# Altium footprint library Library 3D.PcbLib: 288 footprints (part 16 of 18)
Each footprint in its own frame and in the unit in brackets; x right, y up, seen from the top. Pads: shape width x height; smd on the part's side, far side on the other; paste and mask are expansions set on the pad; w line width, h text height; cw(c..) or ccw(c..) is an arc to the next point about the centre after c.
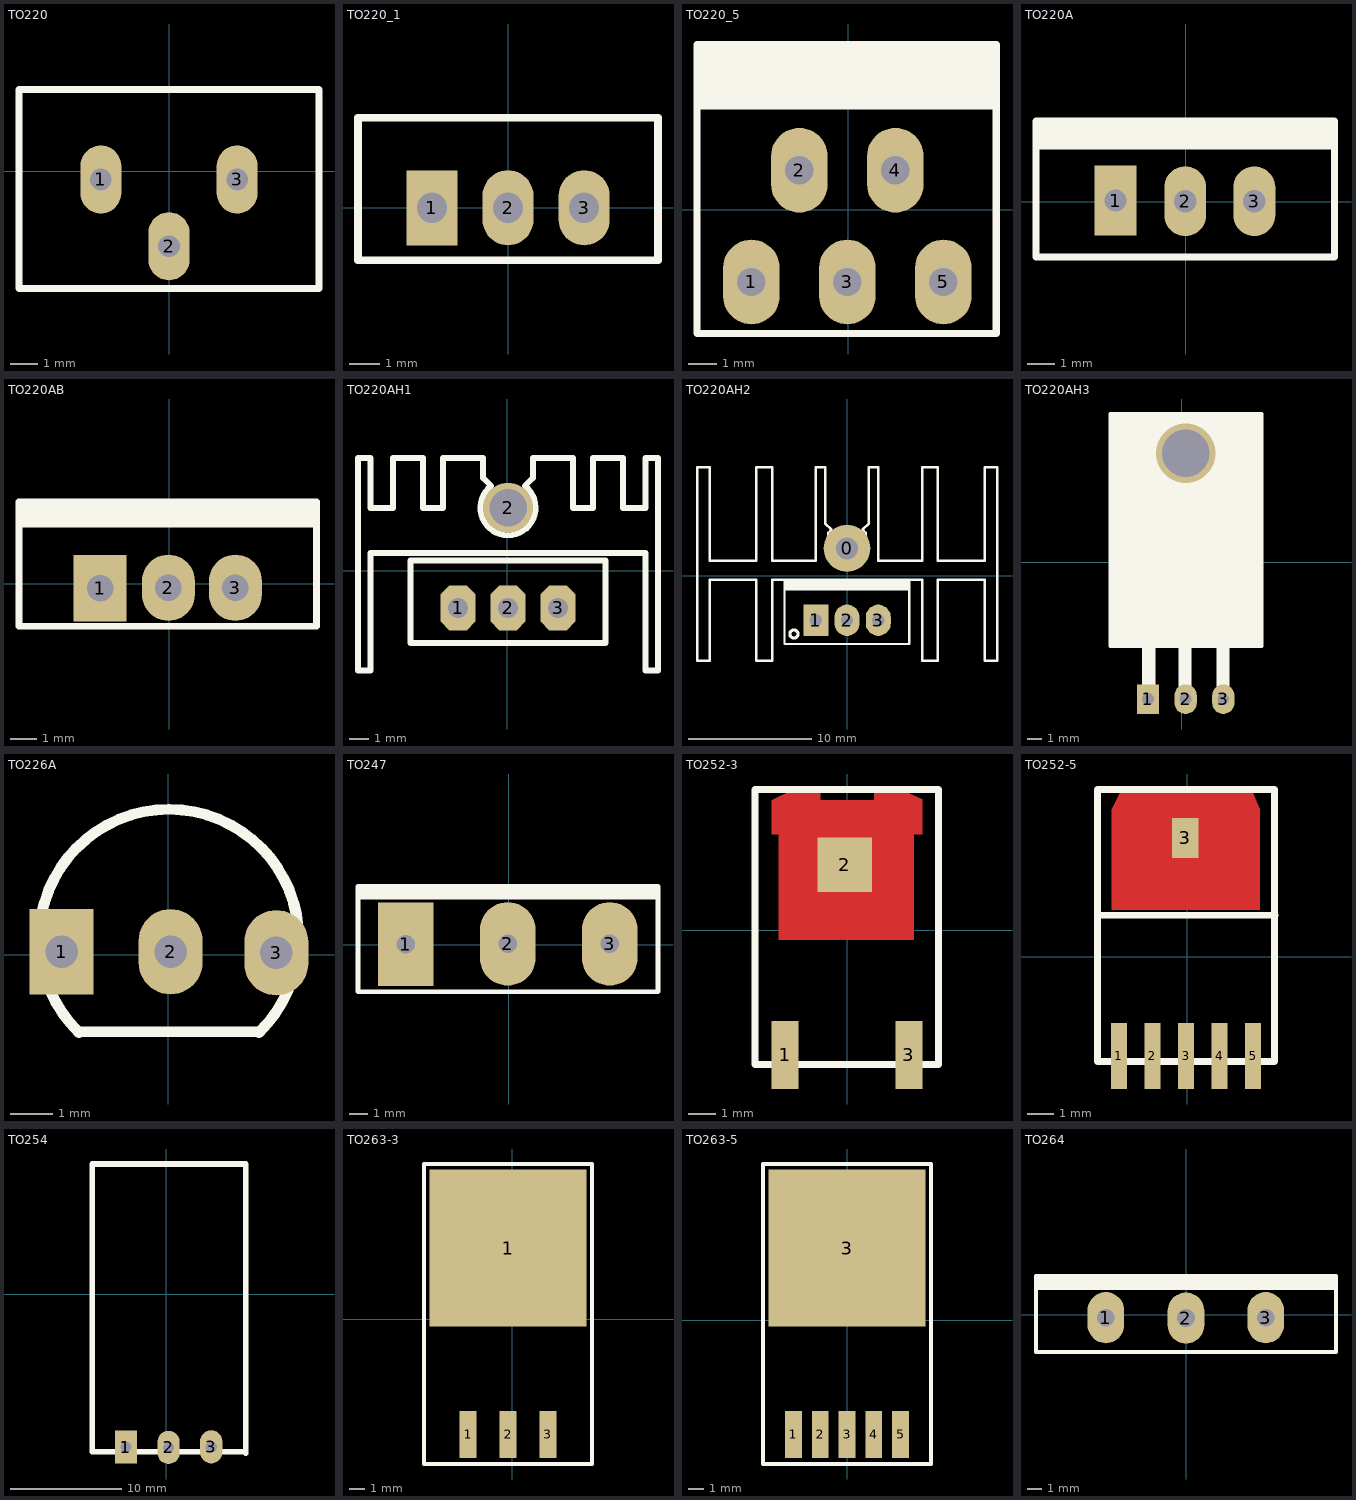
[diagram p15: the footprints below, top view; thin cyan lines are the x and y axes]

## TO220 [mm]
pads (3):
  oval 1.5x2.5 hole 0.8: 1(-2.5,-0.3) 2(0,-2.75) 3(2.5,-0.3)
Top Overlay:
  lines w0.254: -5.5,-4.3 -5.5,3 5.5,3 5.5,-4.3 -5.5,-4.3
3D body "User Library-TO220.STEP": height 23.21, standoff -3.95, extent -5.2,-3 5.2,2.741

## TO220_1 [mm]
pads (3):
  rect 1.7x2.5 hole 1: 1(-2.54,0)
  oval 1.7x2.5 hole 1: 2(0,0) 3(2.54,0)
Top Overlay:
  lines w0.254: -5,-1.75 -5,3 5,3 5,-1.75 -5,-1.75
3D body "TO220.STEP": height 18.95, standoff -9.83, extent -4.95,-1.625 4.95,2.875

## TO220_5 [mm]
pads (5):
  oval 2x3 hole 1: 1(-3.425,-2.555) 2(-1.725,1.4) 3(-0.025,-2.555) 4(1.675,1.4) 5(3.375,-2.555)
Top Overlay:
  rectangle: -5.35,3.55 5.275,5.85
  lines w0.254: -5.35,-4.375 5.25,-4.375 5.25,2.725 5.25,5.85 -5.35,5.85 -5.35,-4.375
3D body "SW3dPS-TO220-5.STEP": height 21.35, standoff -2.64, extent -5.125,-2.62 5.035,5.62

## TO220A [mm]
pads (3):
  rect 1.5x2.5 hole 0.8 square: 1(-2.525,0.05)
  oval 1.5x2.5 hole 0.8 square: 2(-0.025,0.025) 3(2.45,0.025)
Top Overlay:
  rectangle: -5.375,1.875 5.375,2.9
  lines w0.254: -5.375,-1.975 5.325,-1.975 5.325,2.9 -5.375,2.9 -5.375,-1.975
3D body "SW3dPS-TO3B_(TO220)_1.STEP": height 20, standoff -8.4, extent -5.225,-1.8 5.175,2.7

## TO220AB [mm]
pads (3):
  rect 2x2.5 hole 1: 1(-2.6,-0.175)
  oval 2x2.5 hole 1: 2(-0.025,-0.15) 3(2.5,-0.15)
Top Overlay:
  rectangle: -5.657,2.125 5.65,3.09
  lines w0.254: -5.657,-1.6 5.556,-1.6 5.556,3.09 -5.657,3.09 -5.657,-1.6
3D body "SW3dPS-TO220AB.STEP": height 21.33, standoff -8, extent -5.657,-1.6 5.556,3.09

## TO220AH1 [mil]
pads (4):
  oct 70x90 hole 40: 1(-98.46,-73.86) 2(1.54,-73.86) 3(101.54,-73.86)
  round 100 hole 75: 2(1.54,126.14)
Top Overlay:
  lines w12: -32.46,170.14 -48.46,186.14 -48.46,226.14 -128.46,226.14 -128.46,126.14 -168.46,126.14 -168.46,226.14 -228.46,226.14 -228.46,126.14 -273.46,126.14 -273.46,226.14 -298.46,226.14 -298.46,-198.86 -273.46,-198.86 -273.46,36.14 276.54,36.14 276.54,-198.86 301.54,-198.86 301.54,226.14 276.54,226.14 276.54,126.14 231.54,126.14 231.54,226.14 171.54,226.14 171.54,126.14 131.54,126.14 131.54,226.14 51.54,226.14 51.54,186.14 35.13,169.73 ; -32.09,169.66 ccw(c1.54,126.14) 35.3,169.56 ; -193.46,-143.86 -193.46,21.14 196.54,21.14 196.54,-143.86 -193.46,-143.86
3D body "SW3dPS-heatsink TO126.STEP": height 984.25, standoff -149.61, extent -288.43,-176.11 293.51,249.14
3D body "User Library-TO-220-1.STEP": height 322.83, standoff -810.24, extent -195.35,-150.02 194.42,27.14

## TO220AH2 [mil]
pads (4):
  round 150 hole 70: 0(-0.04,87.64)
  rect 80x100 hole 39: 1(-100.04,-142.36)
  oval 80x100 hole 39: 2(-0.04,-142.36) 3(99.96,-142.36)
Top Overlay:
  circle w10: c-170.01,-186.36 r12.97
  rectangle: -201.04,-47.36 197.96,-11.36
  lines w7: -200.04,-42.36 198.46,-42.36 198.96,-49.36 ; -200.04,-217.36 -200.04,-12.36 198.96,-12.36 198.96,-217.36 199.96,-218.36 -176.04,-218.36 -199.04,-218.36 -200.04,-217.36
  lines w8: -480.04,-272.36 -440.04,-272.36 -440.04,-12.36 -290.04,-12.36 -290.04,-272.36 -240.04,-272.36 -240.04,-12.36 239.96,-12.36 239.96,-272.36 289.96,-272.36 289.96,-12.36 439.96,-12.36 439.96,-272.36 479.96,-272.36 479.96,347.64 439.96,347.64 439.96,47.64 289.96,47.64 289.96,347.64 239.96,347.64 239.96,47.64 99.96,47.64 99.96,347.64 69.96,347.64 69.96,167.64 49.96,147.64 59.96,137.64 59.96,67.64 39.96,47.64 -40.04,47.64 -60.04,67.64 -60.04,137.64 -50.04,147.64 -70.04,167.64 -70.04,347.64 -100.04,347.64 -100.04,47.64 -240.04,47.64 -240.04,347.64 -290.04,347.64 -290.04,47.64 -440.04,47.64 -440.04,347.64 -480.04,347.64 -480.04,-272.36
3D body "User Library-heat sink-1.STEP": height 1205.51, standoff 0, extent -460.64,-315.43 440.94,330.24
3D body "User Library-TO-220-1.STEP": height 810.24, standoff -322.83, extent -194.8,-224.53 194.96,-47.36

## TO220AH3 [mm]
pads (3):
  rect 1.5x2 hole 0.8: 1(-2.276,-9.219)
  oval 1.5x2 hole 0.8: 2(0.264,-9.219) 3(2.804,-9.219)
via 0.264,7.343 diameter 4 hole 3.2
Top Overlay:
  rectangle: -4.816,-5.625 5.3,9.871
  rectangle: 2.35,-8.375 3.225,-5.65
  rectangle: -0.2,-8.425 0.675,-5.7
  rectangle: -2.625,-8.4 -1.75,-5.675
  rectangle: -2.675,-8.45 -1.8,-5.725
  lines w0.254: -4.816,-3.358 -4.816,10 5.395,10 5.395,-5.657 -4.816,-5.657 -4.816,3.335 5.395,3.335
3D body "TO220_NAM.step": height 4.45, standoff -1.79, extent -4.816,-9.409 5.344,9.871

## TO226A [mm]
pads (3):
  rect 1.5x2 hole 0.762: 1(-2.5,0.075)
  oval 1.5x2 hole 0.762: 2(0.05,0.075) 3(2.525,0.05)
Top Overlay:
  lines w0.254: -2.093,-1.818 cw(c0.012,0.372) 2.117,-1.818 ; -2.075,-1.8 2.1,-1.8
3D body "User Library-TO-226-BEND LEAD.STEP": height 12.62, standoff -7.7, extent -2.755,-1.47 2.805,2.35

## TO247 [mm]
pads (3):
  rect 3x4.5 hole 1 square: 1(-5.55,0.025)
  oval 3x4.5 hole 1 square: 2(-0.05,0.05) 3(5.45,0.05)
Top Overlay:
  lines w0.254: -8.125,2.575 8,2.575 ; -8.125,2.825 7.975,2.825 ; -7.95,2.95 7.975,2.95 ; -8.125,-2.525 -8.125,3.15 8.05,3.15 8.05,-2.525 -8.125,-2.525
3D body "User Library-TO_247.STEP": height 25, standoff -11.05, extent -7.95,-2.36 7.85,2.95

## TO252-3 [mm]
pads (3):
  rect 1x2.5 smd: 1(-2.284,-4.568) 3(2.262,-4.568)
  rect 2x2 smd: 2(-0.1,2.4)
Top Layer:
  region: -1.954,5.186 -2.767,4.779 -2.767,3.535 -2.513,3.535 -2.513,-0.351 2.44,-0.351 2.44,3.535 2.745,3.535 2.745,4.814 1.932,5.186 0.992,5.186 0.992,4.779 -0.989,4.779 -0.989,5.186
Top Overlay:
  lines w0.254: -3.391,-4.925 3.343,-4.925 3.343,5.175 -3.391,5.175 -3.391,-4.925
3D body "User Library-DPAK_TO-252AA.STEP": height 2.37, standoff -0.03, extent -3.391,-4.925 3.343,5.175

## TO252-5 [mil]
pads (6):
  rect 23.62x98.43 smd: 1(-102,-148) 2(-52,-148) 3(-2,-148) 4(48,-148) 5(98,-148)
  rect 39.37x60 smd: 3(-3,177)
Top Layer:
  region: -98,250 -113,220 -113,70 108,70 108,220 95,250
Top Overlay:
  lines w10: -132.88,62 131,62 ; -133.88,-156.18 129.9,-156.18 129.9,249.3 -133.88,249.3 -133.88,-156.18
3D body "User Library-DPAK-5.STEP": height 94.49, standoff -0.04, extent -133.88,-156.18 129.9,249.3

## TO254 [mm]
pads (3):
  rect 2x3 hole 1: 1(-3.65,-13.8)
  oval 2x3 hole 1: 2(0.2,-13.825) 3(4.05,-13.775)
Top Overlay:
  lines w0.5: -6.688,-14.2 7.004,-14.2 7.155,-14.351 7.155,11.752 7.164,11.761 -6.688,11.761 -6.688,-14.2
3D body "User Library-M-PAK.STEP": height 6.67, standoff -1.33, extent -6.688,-14.351 7.155,11.761

## TO263-3 [mm]
pads (4):
  rect 1.07x3 smd: 1(-2.818,-7.32) 2(-0.278,-7.32) 3(2.262,-7.32)
  rect 10x10 smd: 1(-0.278,4.516)
Top Overlay:
  lines w0.254: -5.612,-9.2 5.056,-9.2 5.056,9.85 -5.612,9.85 -5.612,-5.644 -5.612,-9.2
3D body "SW3dPS-TO263-3.STEP": height 4.78, standoff -0.02, extent -5.278,-7.967 4.722,7.703

## TO263-5 [mm]
pads (6):
  rect 1.07x3 smd: 1(-3.429,-7.261) 2(-1.729,-7.261) 3(-0.029,-7.261) 4(1.671,-7.261) 5(3.371,-7.261)
  rect 10x10 smd: 3(-0.029,4.575)
Top Overlay:
  lines w0.254: -5.363,-9.141 5.305,-9.141 5.305,9.909 -5.363,9.909 -5.363,-5.585 -5.363,-9.141
3D body "SW3dPS-TO263-5.STEP": height 4.79, standoff -0.01, extent -5.029,-7.908 4.971,7.762

## TO264 [mm]
pads (3):
  oval 2.5x3.5 hole 1.2: 1(-5.5,-0.2) 2(-0.025,-0.225) 3(5.425,-0.2)
Top Overlay:
  rectangle: -10.275,1.675 10.15,2.65
  lines w0.254: -10.275,-2.55 -10.275,2.65 10.225,2.65 10.225,-2.55 -10.275,-2.55
3D body "User Library-to264.STEP": height 31.72, standoff -14.25, extent -10.275,-2.55 10.225,2.65